# Altium footprint library 元件1.PcbLib: 420 footprints (part 13 of 27)
Each footprint in its own frame and in the unit in brackets; x right, y up, seen from the top. Pads: shape width x height; smd on the part's side, far side on the other; paste and mask are expansions set on the pad; w line width, h text height; cw(c..) or ccw(c..) is an arc to the next point about the centre after c.
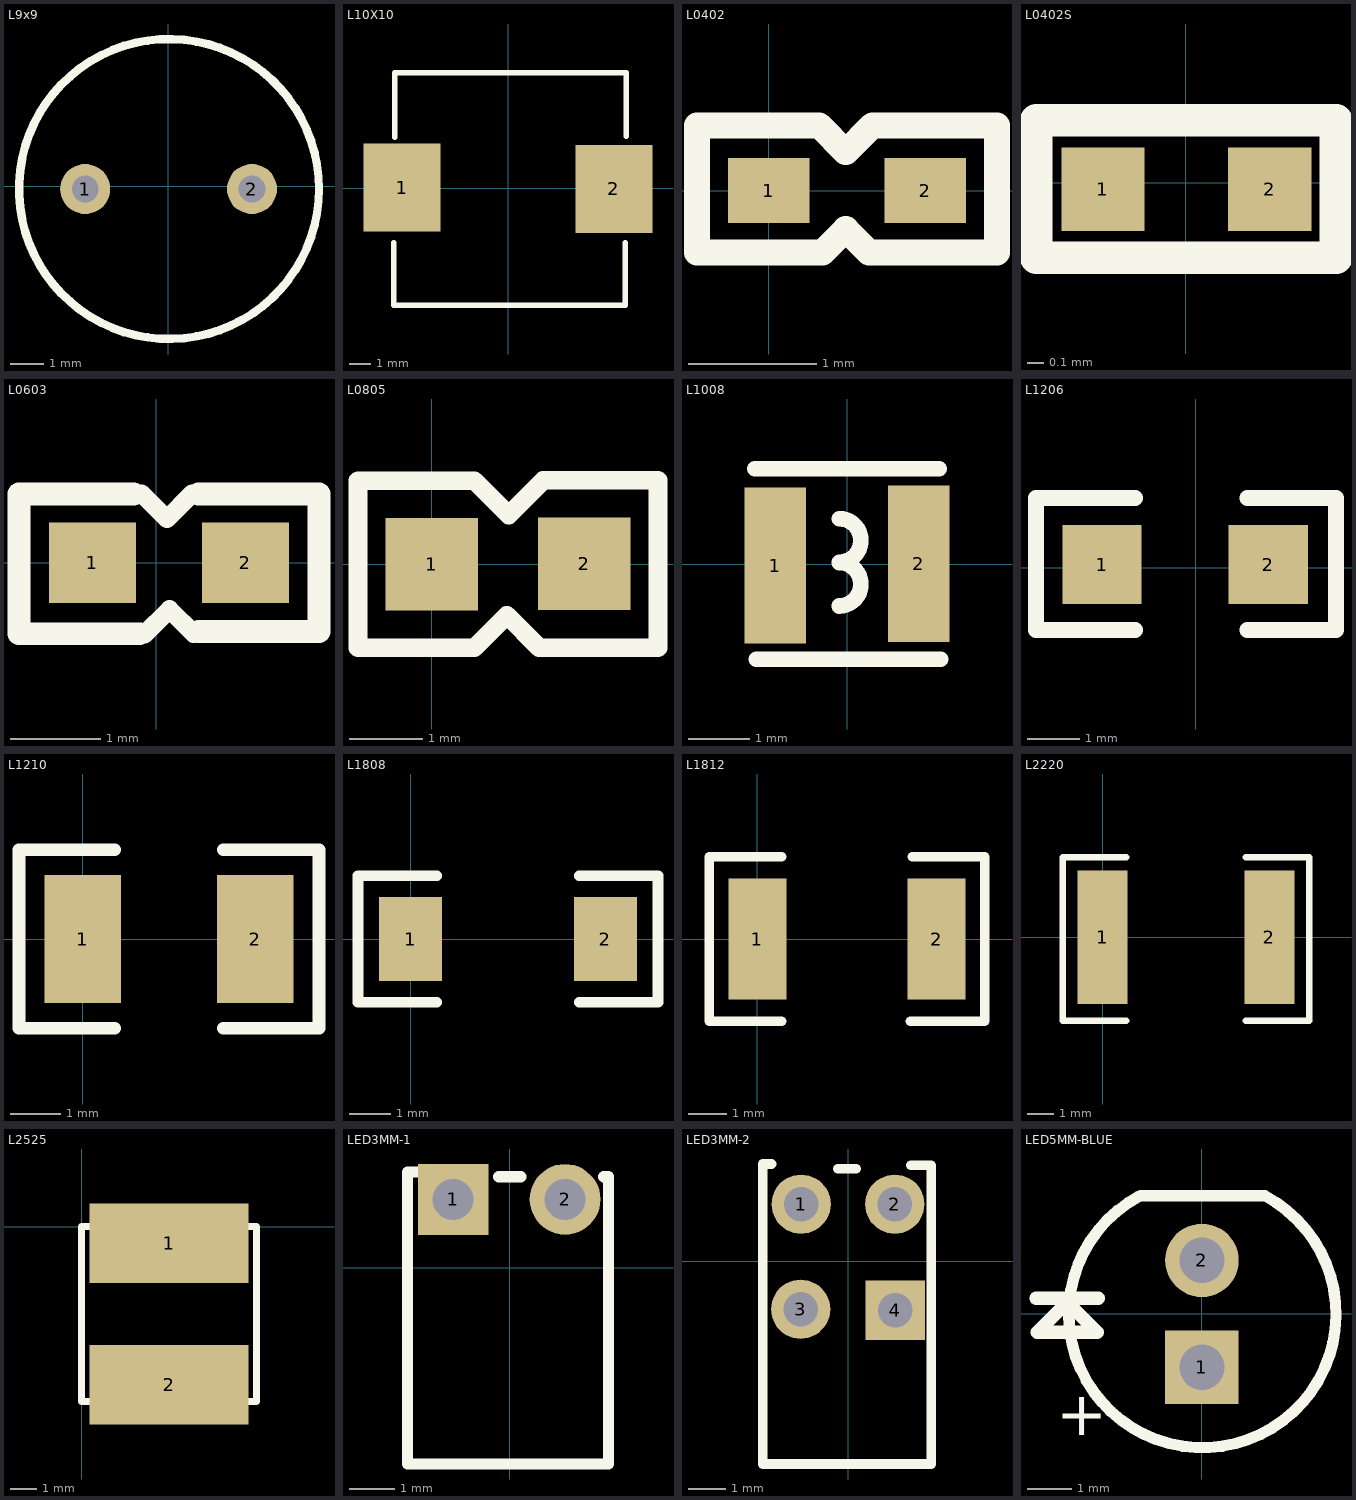
[diagram p12: the footprints below, top view; thin cyan lines are the x and y axes]

## L9x9 [mm] "L?"
pads (2):
  round 1.5 hole 0.8: 1(-2.489,-0.076) 2(2.515,-0.076)
Top Overlay:
  circle w0.254: c0.025,-0.076 r4.5
3D body "RLB9012-222KL Radial Inductor [Bourns] (Pitch 0_7mm).step": height 11.8, standoff -30, extent -4.526,-4.649 4.474,4.351

## L10X10 [mil]
pads (2):
  rect 140x160 smd: 1(-192.08,1.25) 2(192.08,-1.25)
Top Overlay:
  lines w10: -207.08,-98.75 -207.08,-212.08 212.92,-212.08 212.92,-98.75 ; -205.42,92.92 -205.42,209.58 214.58,209.58 214.58,94.58
3D body: height 157.48, standoff 0, extent -207,-213 215,211

## L0402 [mil]
pads (2):
  rect 25x20 smd: 1(0,0) 2(48,0)
Top Overlay:
  lines w8: -22,-19 -22,20 15.43,20 23.62,11.81 31.81,20 70,20 70,-19 30.81,-19 23.62,-11.81 16.43,-19 -22,-19
3D body: height 10, standoff 0, extent 41,-10 44,10
3D body: height 10, standoff 0, extent 5,-10 8,10
3D body: height 10, standoff 0, extent 8,-10 41,10

## L0402S [mil] "1/16W"
pads (2):
  rect 20x20 smd: 1(-19.93,-1.58) 2(20.07,-1.58)
Top Overlay:
  lines w7.87: -36,-18 36,-18 36,15 -36,15 -36,-18
3D body: height 10, standoff 0, extent 16.5,-11.58 19.5,8.42
3D body: height 10, standoff 0, extent -19.5,-11.58 -16.5,8.42
3D body: height 10, standoff 0, extent -16.5,-11.58 16.5,8.42

## L0603 [mil]
pads (2):
  rect 38x35 smd: 1(-28,0) 2(38.87,0)
Top Overlay:
  lines w8: -6.53,30.27 4.6,19.14 15.58,30.12 ; -5.3,-31.36 5.7,-20.36 16.32,-30.98
  lines w10: -9.9,30 -60,30 -60,-31 -7.3,-31 ; 18.4,30 71,30 71,-30 18.6,-30
3D body: height 20, standoff 0, extent -16,-15 28,15
3D body: height 20, standoff 0, extent 28,-15 36,15
3D body: height 20, standoff 0, extent -24,-15 -16,15

## L0805 [mm] "1/8W"
pads (2):
  rect 1.27x1.27 smd: 1(0,0) 2(2.09,0.005)
Top Overlay:
  lines w0.254: -1.011,-1.143 0.584,-1.143 1.029,-0.699 1.473,-1.143 3.099,-1.143 3.099,1.148 1.529,1.148 1.054,0.673 0.584,1.143 -1.011,1.143 -1.011,-1.143
3D body "R0805.STEP": height 0.55, standoff 0, extent 0.036,-0.62 2.036,0.64

## L1008 [mil] "2520"
height 209.84
pads (2):
  rect 39.37x100 smd: 1(-46,-1) 2(46,0.13)
Top Overlay:
  lines w10: -59.06,61 59.06,61 ; -58.11,-61 60,-61 ; -5,-26.86 ccw(c-5,-12.93) -5,1 ; -5,1.14 ccw(c-5,15.07) -5,29
3D body "AISC-1008F.STEP": height 91.14, standoff 0.09, extent -57.48,-54.92 57.48,54.93

## L1206 [mil] "1/4W"
pads (2):
  rect 60x60 smd: 1(-70.98,2.53) 2(55,2.53)
Top Overlay:
  lines w12: -46,-47 -121,-47 -121,53 -46,53 ; 39,-47 106.3,-47 106.3,53 39,53
3D body "V1206HD.STEP": height 62.99, standoff 0, extent -70.98,-27 55,32.06

## L1210 [mil]
pads (2):
  rect 60x100 smd: 1(0,0) 2(135,0)
Top Overlay:
  lines w10: 25,-70 -50,-70 -50,70 25,70 ; 110,-70 185,-70 185,70 110,70
3D body "L1210.STEP": height 78.74, standoff 0, extent 7.09,-51.96 131.11,46.48

## L1808 [mil]
pads (2):
  rect 60x80 smd: 1(0,0) 2(185,0)
Top Overlay:
  lines w10: 25,-60 -50,-60 -50,60 25,60 ; 160,-60 235,-60 235,60 160,60
3D body "R1808(4520M)1.STEP": height 39.37, standoff 0, extent 2,-39 179.77,37.49

## L1812 [mil]
pads (2):
  rect 60x125 smd: 1(0,0) 2(185,0)
Top Overlay:
  lines w10: 25,-85 -50,-85 -50,85 25,85 ; 158,-85 160,-85 235,-85 235,85 160,85 ; 159,-85 161,-85
3D body "L1812.STEP": height 118.11, standoff -2.01, extent 1.89,-63 184.11,62.98

## L2220 [mm]
pads (2):
  rect 1.905x5.08 smd: 1(0,0) 2(6.35,0)
Top Overlay:
  lines w0.254: 0.889,-3.175 -1.524,-3.175 -1.524,3.048 0.889,3.048 ; 5.461,-3.175 7.874,-3.175 7.874,3.048 5.461,3.048
3D body "L2220.STEP": height 2.5, standoff 0, extent 0.3,-2.489 6,2.511

## L2525 [mm]
pads (2):
  rect 6x3 smd: 1(3.302,-0.635) 2(3.302,-5.969)
Top Overlay:
  lines w0.254: 0,-6.604 0,0 6.604,0 6.604,-6.604 0,-6.604
3D body "电感.": height 4.5, standoff -0.01, extent 0.702,-6.133 5.902,-0.42

## LED3MM-1 [mil]
pads (2):
  rect 62x62 hole 36 mask+5: 1(-49.5,60)
  round 62 hole 36 mask+5: 2(48.5,60)
Top Overlay:
  lines w10: -80.5,84 -89.5,84 -89.5,-171.76 86.5,-171.76 86.5,80 82.5,80 ; -9.5,80 9.5,80
3D body "1LED.STEP": height 290.42, standoff -135.56, extent -87.58,-433 89.58,73.69

## LED3MM-2 [mil]
pads (4):
  round 62 hole 36 mask+5: 1(-49.5,60) 2(48.5,60) 3(-50,-50)
  rect 62x62 hole 36 mask+5: 4(49,-51)
Top Overlay:
  lines w10: -80.5,102.01 -89.5,102.01 -89.5,-212 86.5,-212 86.5,100.5 65,100.5 ; -11,97 8,97
3D body "22LED.step": height 386.81, standoff -118.31, extent -87,-322.01 83.08,102.01

## LED5MM-BLUE [mm]
pads (2):
  rect 1.65x1.651 hole 1.016 mask+0.03: 1(0,-1.2)
  oval 1.65x1.651 hole 1.016 mask+0.03: 2(0,1.2)
Top Overlay:
  lines w0.254: -1.4,2.644 ccw(c0.009,-0.005) 1.411,2.647 -1.378,2.647
  lines w0.3: -3.725,0.351 -2.328,0.351 ; -3.7,-0.411 -2.608,-0.411 -2.354,-0.411 -3.027,0.262 -3.7,-0.411
  text "+" at -3.268,-2.723 h1
3D body "LED5_BLUE.STEP": height 8.6, standoff -2, extent -2.85,-2.824 2.85,2.526